# Altium footprint library texas.PCBLIB: 168 footprints (part 7 of 14)
Each footprint in its own frame and in the unit in brackets; x right, y up, seen from the top. Pads: shape width x height; smd on the part's side, far side on the other; paste and mask are expansions set on the pad; w line width, h text height; cw(c..) or ccw(c..) is an arc to the next point about the centre after c.
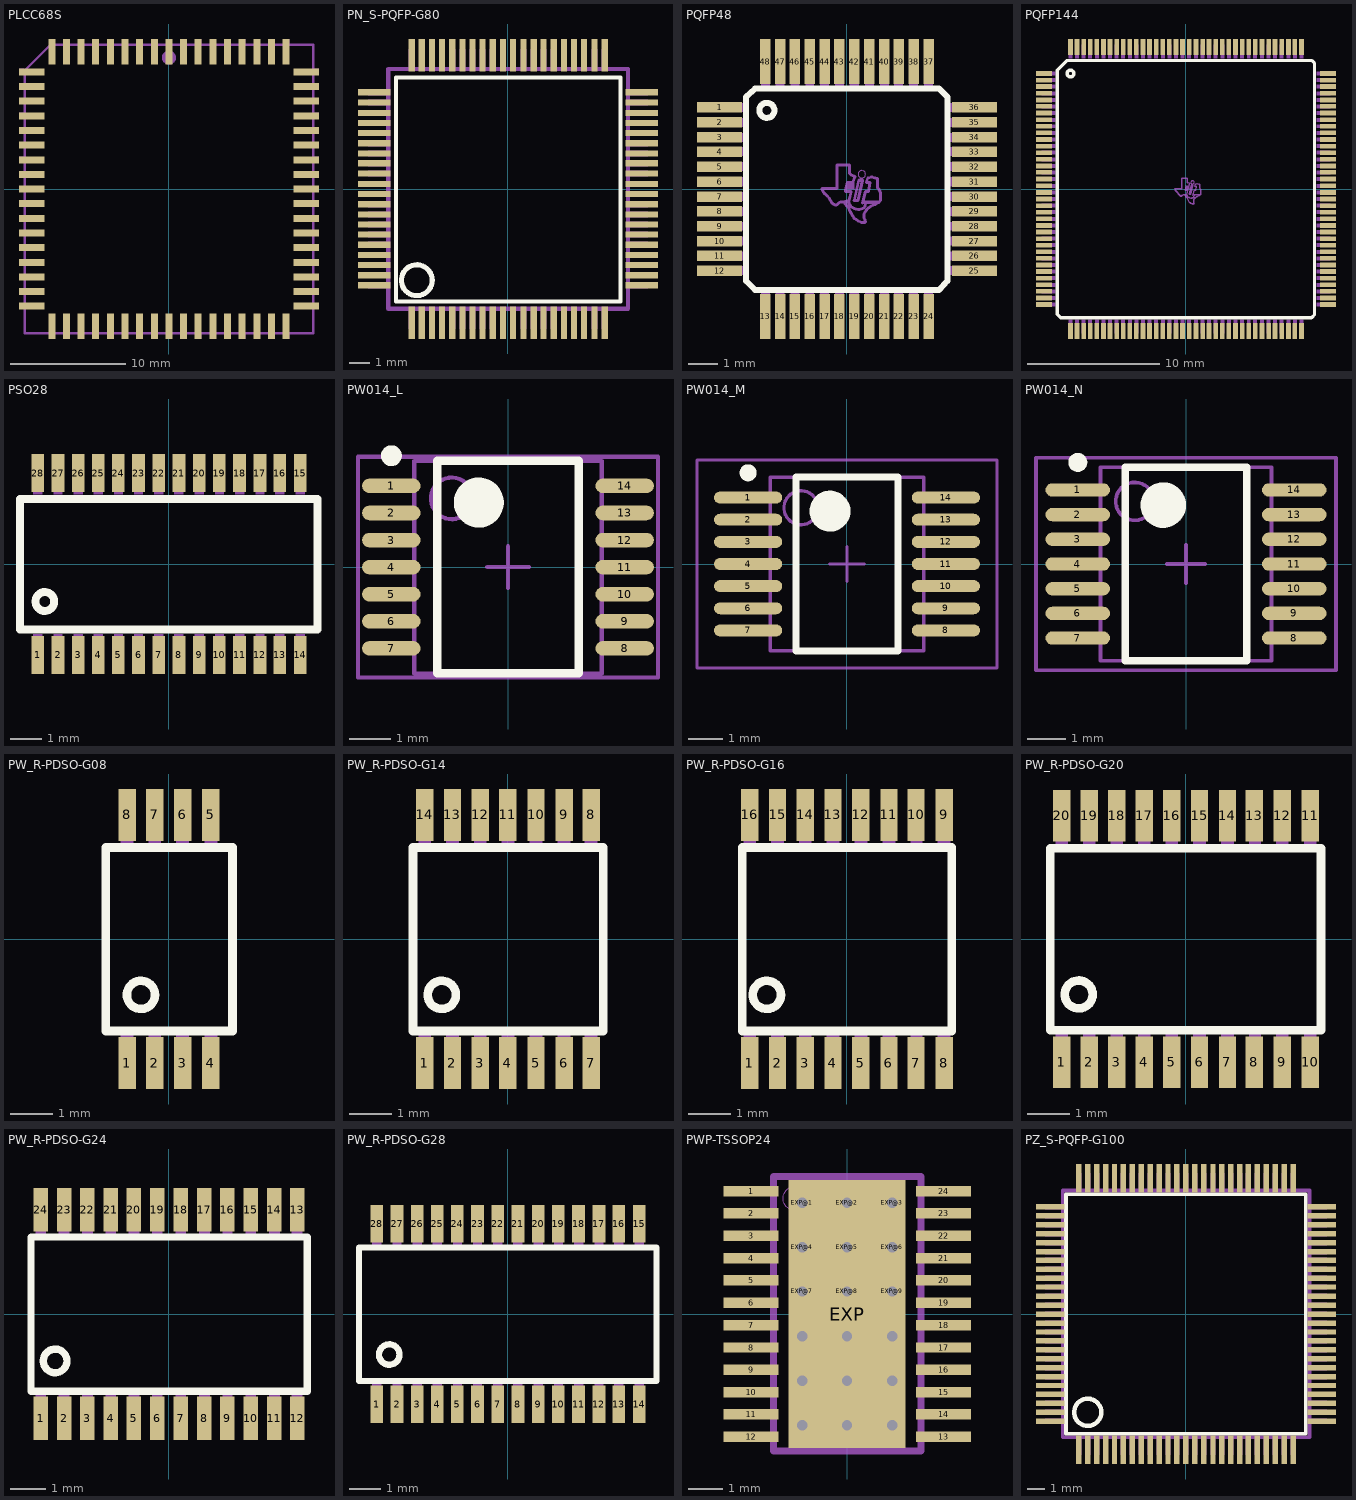
[diagram p6: the footprints below, top view; thin cyan lines are the x and y axes]

## PLCC68S [mil]
pads (68):
  rect 24x87 smd: 1(0,469) 2(-50,469) 3(-100,469) 4(-150,469) 5(-200,469) 6(-250,469) 7(-300,469) 8(-350,469) 9(-400,469) 27(-400,-468.5) 28(-350,-468.5) 29(-300,-468.5) 30(-250,-468.5) 31(-200,-468.5) 32(-150,-468.5) 33(-100,-468.5) 34(-50,-468.5) 35(0,-468.5) 36(50,-468.5) 37(100,-468.5) 38(150,-468.5) 39(200,-468.5) 40(250,-468.5) 41(300,-468.5) 42(350,-468.5) 43(400,-468.5) 61(400,469) 62(350,469) 63(300,469) 64(250,469) 65(200,469) 66(150,469) 67(100,469) 68(50,469)
  rect 87x24 smd: 10(-468.5,400) 11(-468.5,350) 12(-468.5,300) 13(-468.5,250) 14(-468.5,200) 15(-468.5,150) 16(-468.5,100) 17(-468.5,50) 18(-468.5,0) 19(-468.5,-50) 20(-468.5,-100) 21(-468.5,-150) 22(-468.5,-200) 23(-468.5,-250) 24(-468.5,-300) 25(-468.5,-350) 26(-468.5,-400) 44(469,-400) 45(469,-350) 46(469,-300) 47(469,-250) 48(469,-200) 49(469,-150) 50(469,-100) 51(469,-50) 52(469,0) 53(469,50) 54(469,100) 55(469,150) 56(469,200) 57(469,250) 58(469,300) 59(469,350) 60(469,400)
Mechanical 4:
  circle w24: c0,449 r12
  rectangle: -10.24,495 11,512
  rectangle: -60.24,495 -39.76,512
  rectangle: -110.24,495 -89.76,512
  rectangle: -160.24,495 -139.76,512
  rectangle: -210.24,495 -189.76,512
  rectangle: -260.24,495 -239.76,512
  rectangle: -310.24,495 -289.76,512
  rectangle: -360.24,495 -339.76,512
  rectangle: -410.24,495 -389.76,512
  rectangle: -511.81,390 -494.09,411
  rectangle: -511.81,340 -494.09,361
  rectangle: -511.81,290 -494.09,311
  rectangle: -511.81,240 -494.09,261
  rectangle: -511.81,190 -494.09,211
  rectangle: -511.81,140 -494.09,161
  rectangle: -511.81,90 -494.09,111
  rectangle: -511.81,40 -494.09,61
  rectangle: -511.81,-10.24 -494.09,11
  rectangle: -511.81,-60.24 -494.09,-39.76
  rectangle: -511.81,-110.24 -494.09,-89.76
  rectangle: -511.81,-160.24 -494.09,-139.76
  rectangle: -511.81,-210.24 -494.09,-189.76
  rectangle: -511.81,-260.24 -494.09,-239.76
  rectangle: -511.81,-310.24 -494.09,-289.76
  rectangle: -511.81,-360.24 -494.09,-339.76
  rectangle: -511.81,-410.24 -494.09,-389.76
  rectangle: -410.24,-511.81 -389.76,-494.09
  rectangle: -360.24,-511.81 -339.76,-494.09
  rectangle: -310.24,-511.81 -289.76,-494.09
  rectangle: -260.24,-511.81 -239.76,-494.09
  rectangle: -210.24,-511.81 -189.76,-494.09
  rectangle: -160.24,-511.81 -139.76,-494.09
  rectangle: -110.24,-511.81 -89.76,-494.09
  rectangle: -60.24,-511.81 -39.76,-494.09
  rectangle: -10.24,-511.81 11,-494.09
  rectangle: 40,-511.81 61,-494.09
  rectangle: 90,-511.81 111,-494.09
  rectangle: 140,-511.81 161,-494.09
  rectangle: 190,-511.81 211,-494.09
  rectangle: 240,-511.81 261,-494.09
  rectangle: 290,-511.81 311,-494.09
  rectangle: 340,-511.81 361,-494.09
  rectangle: 390,-511.81 411,-494.09
  rectangle: 495,-410.24 512,-389.76
  rectangle: 495,-360.24 512,-339.76
  rectangle: 495,-310.24 512,-289.76
  rectangle: 495,-260.24 512,-239.76
  rectangle: 495,-210.24 512,-189.76
  rectangle: 495,-160.24 512,-139.76
  rectangle: 495,-110.24 512,-89.76
  rectangle: 495,-60.24 512,-39.76
  rectangle: 495,-10.24 512,11
  rectangle: 495,40 512,61
  rectangle: 495,90 512,111
  rectangle: 495,140 512,161
  rectangle: 495,190 512,211
  rectangle: 495,240 512,261
  rectangle: 495,290 512,311
  rectangle: 495,340 512,361
  rectangle: 495,390 512,411
  rectangle: 390,495 411,512
  rectangle: 340,495 361,512
  rectangle: 290,495 311,512
  rectangle: 240,495 261,512
  rectangle: 190,495 211,512
  rectangle: 140,495 161,512
  rectangle: 90,495 111,512
  rectangle: 40,495 61,512
  lines w8: -492.13,-492.13 -492.13,405 -404.13,493 493,493 493,-492.13 -492.13,-492.13

## PN_S-PQFP-G80 [mil]
pads (80):
  rect 12x63 smd: 1(-187.01,-259.84) 2(-167.32,-259.84) 3(-147.64,-259.84) 4(-127.95,-259.84) 5(-108.27,-259.84) 6(-88.58,-259.84) 7(-68.9,-259.84) 8(-49.21,-259.84) 9(-29.53,-259.84) 10(-9.84,-259.84) 11(10,-259.84) 12(30,-259.84) 13(50,-259.84) 14(69,-259.84) 15(89,-259.84) 16(109,-259.84) 17(128,-259.84) 18(148,-259.84) 19(168,-259.84) 20(188,-259.84) 41(188,260) 42(168,260) 43(148,260) 44(128,260) 45(109,260) 46(89,260) 47(69,260) 48(50,260) 49(30,260) 50(10,260) 51(-9.84,260) 52(-29.53,260) 53(-49.21,260) 54(-68.9,260) 55(-88.58,260) 56(-108.27,260) 57(-127.95,260) 58(-147.64,260) 59(-167.32,260) 60(-187.01,260)
  rect 63x12 smd: 21(260,-187.01) 22(260,-167.32) 23(260,-147.64) 24(260,-127.95) 25(260,-108.27) 26(260,-88.58) 27(260,-68.9) 28(260,-49.21) 29(260,-29.53) 30(260,-9.84) 31(260,10) 32(260,30) 33(260,50) 34(260,69) 35(260,89) 36(260,109) 37(260,128) 38(260,148) 39(260,168) 40(260,188) 61(-259.84,188) 62(-259.84,168) 63(-259.84,148) 64(-259.84,128) 65(-259.84,109) 66(-259.84,89) 67(-259.84,69) 68(-259.84,50) 69(-259.84,30) 70(-259.84,10) 71(-259.84,-9.84) 72(-259.84,-29.53) 73(-259.84,-49.21) 74(-259.84,-68.9) 75(-259.84,-88.58) 76(-259.84,-108.27) 77(-259.84,-127.95) 78(-259.84,-147.64) 79(-259.84,-167.32) 80(-259.84,-187.01)
Top Overlay:
  circle w10: c-177.17,-177.17 r30
  lines w8: -217.32,-218.5 218.5,-218.5 218.5,216.54 -217.32,216.54 -217.32,-218.5
Mechanical 4:
  rectangle: -271.65,-192.91 -234.25,-181.1
  rectangle: -271.65,-173.23 -234.25,-161.42
  rectangle: -271.65,-153.54 -234.25,-141.73
  rectangle: -271.65,-133.86 -234.25,-122.05
  rectangle: -271.65,-114.17 -234.25,-102.36
  rectangle: -271.65,-94.49 -234.25,-82.68
  rectangle: -271.65,-74.8 -234.25,-62.99
  rectangle: -271.65,-55.12 -234.25,-43.31
  rectangle: -271.65,-35.43 -234.25,-23.62
  rectangle: -271.65,-15.75 -234.25,-3.94
  rectangle: -271.65,4 -234.25,16
  rectangle: -271.65,24 -234.25,36
  rectangle: -271.65,44 -234.25,56
  rectangle: -271.65,63 -234.25,75
  rectangle: -271.65,83 -234.25,95
  rectangle: -271.65,103 -234.25,115
  rectangle: -271.65,123 -234.25,134
  rectangle: -271.65,142 -234.25,154
  rectangle: -271.65,162 -234.25,174
  rectangle: -271.65,182 -234.25,193
  rectangle: -192.91,235 -181.1,272
  rectangle: -173.23,235 -161.42,272
  rectangle: -153.54,235 -141.73,272
  rectangle: -133.86,235 -122.05,272
  rectangle: -114.17,235 -102.36,272
  rectangle: -94.49,235 -82.68,272
  rectangle: -74.8,235 -62.99,272
  rectangle: -55.12,235 -43.31,272
  rectangle: -35.43,235 -23.62,272
  rectangle: -15.75,235 -3.94,272
  rectangle: 4,235 16,272
  rectangle: 24,235 36,272
  rectangle: 44,235 56,272
  rectangle: 63,235 75,272
  rectangle: 83,235 95,272
  rectangle: 103,235 115,272
  rectangle: 123,235 134,272
  rectangle: 142,235 154,272
  rectangle: 162,235 174,272
  rectangle: 182,235 193,272
  rectangle: 235,182 272,193
  rectangle: 235,162 272,174
  rectangle: 235,142 272,154
  rectangle: 235,123 272,134
  rectangle: 235,103 272,115
  rectangle: 235,83 272,95
  rectangle: 235,63 272,75
  rectangle: 235,44 272,56
  rectangle: 235,24 272,36
  rectangle: 235,4 272,16
  rectangle: 235,-15.75 272,-3.94
  rectangle: 235,-35.43 272,-23.62
  rectangle: 235,-55.12 272,-43.31
  rectangle: 235,-74.8 272,-62.99
  rectangle: 235,-94.49 272,-82.68
  rectangle: 235,-114.17 272,-102.36
  rectangle: 235,-133.86 272,-122.05
  rectangle: 235,-153.54 272,-141.73
  rectangle: 235,-173.23 272,-161.42
  rectangle: 235,-192.91 272,-181.1
  rectangle: 182,-271.65 193,-234.25
  rectangle: 162,-271.65 174,-234.25
  rectangle: 142,-271.65 154,-234.25
  rectangle: 123,-271.65 134,-234.25
  rectangle: 103,-271.65 115,-234.25
  rectangle: 83,-271.65 95,-234.25
  rectangle: 63,-271.65 75,-234.25
  rectangle: 44,-271.65 56,-234.25
  rectangle: 24,-271.65 36,-234.25
  rectangle: 4,-271.65 16,-234.25
  rectangle: -15.75,-271.65 -3.94,-234.25
  rectangle: -35.43,-271.65 -23.62,-234.25
  rectangle: -55.12,-271.65 -43.31,-234.25
  rectangle: -74.8,-271.65 -62.99,-234.25
  rectangle: -94.49,-271.65 -82.68,-234.25
  rectangle: -114.17,-271.65 -102.36,-234.25
  rectangle: -133.86,-271.65 -122.05,-234.25
  rectangle: -153.54,-271.65 -141.73,-234.25
  rectangle: -173.23,-271.65 -161.42,-234.25
  rectangle: -192.91,-271.65 -181.1,-234.25
  lines w8: -232.68,-232.68 -232.68,233 233,233 233,-232.68 -232.68,-232.68
3D body "PN0080A.stp": height 61.4, standoff -0.02, extent -275.39,-275.59 275.79,275.59

## PQFP48 [mil]
pads (48):
  rect 60x14 smd: 1(-169.29,109) 2(-169.29,89) 3(-169.29,69) 4(-169.29,50) 5(-169.29,30) 6(-169.29,10) 7(-169.29,-9.84) 8(-169.29,-29.53) 9(-169.29,-49.21) 10(-169.29,-68.9) 11(-169.29,-88.58) 12(-169.29,-108.27) 25(170,-108.27) 26(170,-88.58) 27(170,-68.9) 28(170,-49.21) 29(170,-29.53) 30(170,-9.84) 31(170,10) 32(170,30) 33(170,50) 34(170,69) 35(170,89) 36(170,109)
  rect 14x60 smd: 13(-108.27,-169.29) 14(-88.58,-169.29) 15(-68.9,-169.29) 16(-49.21,-169.29) 17(-29.53,-169.29) 18(-9.84,-169.29) 19(10,-169.29) 20(30,-169.29) 21(50,-169.29) 22(69,-169.29) 23(89,-169.29) 24(109,-169.29) 37(109,170) 38(89,170) 39(69,170) 40(50,170) 41(30,170) 42(10,170) 43(-9.84,170) 44(-29.53,170) 45(-49.21,170) 46(-68.9,170) 47(-88.58,170) 48(-108.27,170)
Top Overlay:
  circle w8: c-106.3,105 r10
  lines w8: -133.86,-122.05 -133.86,123 -122.05,134 123,134 134,123 134,-122.05 123,-133.86 -122.05,-133.86 -133.86,-122.05
Mechanical 4:
  drawing of 146 lines, arcs and shapes, not listed

## PQFP144 [mil]
pads (144):
  rect 48x14 smd: 1(-423.23,345) 2(-423.23,325) 3(-423.23,306) 4(-423.23,286) 5(-423.23,266) 6(-423.23,247) 7(-423.23,227) 8(-423.23,207) 9(-423.23,188) 10(-423.23,168) 11(-423.23,148) 12(-423.23,128) 13(-423.23,109) 14(-423.23,89) 15(-423.23,69) 16(-423.23,50) 17(-423.23,30) 18(-423.23,10) 19(-423.23,-9.84) 20(-423.23,-29.53) 21(-423.23,-49.21) 22(-423.23,-68.9) 23(-423.23,-88.58) 24(-423.23,-108.27) 25(-423.23,-127.95) 26(-423.23,-147.64) 27(-423.23,-167.32) 28(-423.23,-187.01) 29(-423.23,-206.69) 30(-423.23,-226.38) 31(-423.23,-246.06) 32(-423.23,-265.75) 33(-423.23,-285.43) 34(-423.23,-305.12) 35(-423.23,-324.8) 36(-423.23,-344.49) 73(424,-344.49) 74(424,-324.8) 75(424,-305.12) 76(424,-285.43) 77(424,-265.75) 78(424,-246.06) 79(424,-226.38) 80(424,-206.69) 81(424,-187.01) 82(424,-167.32) 83(424,-147.64) 84(424,-127.95) 85(424,-108.27) 86(424,-88.58) 87(424,-68.9) 88(424,-49.21) 89(424,-29.53) 90(424,-9.84) 91(424,10) 92(424,30) 93(424,50) 94(424,69) 95(424,89) 96(424,109) 97(424,128) 98(424,148) 99(424,168) 100(424,188) 101(424,207) 102(424,227) 103(424,247) 104(424,266) 105(424,286) 106(424,306) 107(424,325) 108(424,345)
  rect 14x48 smd: 37(-344.49,-423.23) 38(-324.8,-423.23) 39(-305.12,-423.23) 40(-285.43,-423.23) 41(-265.75,-423.23) 42(-246.06,-423.23) 43(-226.38,-423.23) 44(-206.69,-423.23) 45(-187.01,-423.23) 46(-167.32,-423.23) 47(-147.64,-423.23) 48(-127.95,-423.23) 49(-108.27,-423.23) 50(-88.58,-423.23) 51(-68.9,-423.23) 52(-49.21,-423.23) 53(-29.53,-423.23) 54(-9.84,-423.23) 55(10,-423.23) 56(30,-423.23) 57(50,-423.23) 58(69,-423.23) 59(89,-423.23) 60(109,-423.23) 61(128,-423.23) 62(148,-423.23) 63(168,-423.23) 64(188,-423.23) 65(207,-423.23) 66(227,-423.23) 67(247,-423.23) 68(266,-423.23) 69(286,-423.23) 70(306,-423.23) 71(325,-423.23) 72(345,-423.23) 109(345,424) 110(325,424) 111(306,424) 112(286,424) 113(266,424) 114(247,424) 115(227,424) 116(207,424) 117(188,424) 118(168,424) 119(148,424) 120(128,424) 121(109,424) 122(89,424) 123(69,424) 124(50,424) 125(30,424) 126(10,424) 127(-9.84,424) 128(-29.53,424) 129(-49.21,424) 130(-68.9,424) 131(-88.58,424) 132(-108.27,424) 133(-127.95,424) 134(-147.64,424) 135(-167.32,424) 136(-187.01,424) 137(-206.69,424) 138(-226.38,424) 139(-246.06,424) 140(-265.75,424) 141(-285.43,424) 142(-305.12,424) 143(-324.8,424) 144(-344.49,424)
Top Overlay:
  circle w10: c-344.49,345 r10
  lines w10: -383.86,-374.02 -383.86,355 -354.33,384 375,384 384,375 384,-374.02 375,-383.86 -374.02,-383.86 -383.86,-374.02
Mechanical 4:
  drawing of 242 lines, arcs and shapes, not listed
  text "PGE(S-PQFP-G144)" at -150,-324.02 h37.2

## PSO28 [mil]
pads (28):
  rect 16x48 smd: 1(-166.34,-115.16) 2(-140.75,-115.16) 3(-115.16,-115.16) 4(-89.57,-115.16) 5(-63.98,-115.16) 6(-38.39,-115.16) 7(-12.8,-115.16) 8(13,-115.16) 9(39,-115.16) 10(64,-115.16) 11(90,-115.16) 12(116,-115.16) 13(141,-115.16) 14(167,-115.16) 15(167,116) 16(141,116) 17(116,116) 18(90,116) 19(64,116) 20(39,116) 21(13,116) 22(-12.8,116) 23(-38.39,116) 24(-63.98,116) 25(-89.57,116) 26(-115.16,116) 27(-140.75,116) 28(-166.34,116)
Top Overlay:
  circle w10: c-157.48,-47.24 r12
  lines w10: -188.98,-82.68 189,-82.68 189,83 -188.98,83 -188.98,-82.68
Mechanical 4:
  rectangle: -172.24,-129.92 -160.43,-88.58
  rectangle: -146.65,-129.92 -134.84,-88.58
  rectangle: -121.06,-129.92 -109.25,-88.58
  rectangle: -95.47,-129.92 -83.66,-88.58
  rectangle: -69.88,-129.92 -58.07,-88.58
  rectangle: -44.29,-129.92 -32.48,-88.58
  rectangle: -18.7,-129.92 -6.89,-88.58
  rectangle: 7,-129.92 19,-88.58
  rectangle: 33,-129.92 45,-88.58
  rectangle: 59,-129.92 70,-88.58
  rectangle: 84,-129.92 96,-88.58
  rectangle: 110,-129.92 122,-88.58
  rectangle: 135,-129.92 147,-88.58
  rectangle: 161,-129.92 173,-88.58
  rectangle: 161,89 173,130
  rectangle: 135,89 147,130
  rectangle: 110,89 122,130
  rectangle: 84,89 96,130
  rectangle: 59,89 70,130
  rectangle: 33,89 45,130
  rectangle: 7,89 19,130
  rectangle: -18.7,89 -6.89,130
  rectangle: -44.29,89 -32.48,130
  rectangle: -69.88,89 -58.07,130
  rectangle: -95.47,89 -83.66,130
  rectangle: -121.06,89 -109.25,130
  rectangle: -146.65,89 -134.84,130
  rectangle: -172.24,89 -160.43,130

## PW014_L [mm] "TSOP, 14-Leads, Body 5x4.4mm, Pitch 0.65mm, IPC High Density"
height 1.2
pads (14):
  oval 1.4x0.35 smd: 1(-2.8,1.95) 2(-2.8,1.3) 3(-2.8,0.65) 4(-2.8,0) 5(-2.8,-0.65) 6(-2.8,-1.3) 7(-2.8,-1.95) 8(2.8,-1.95) 9(2.8,-1.3) 10(2.8,-0.65) 11(2.8,0) 12(2.8,0.65) 13(2.8,1.3) 14(2.8,1.95)
Top Overlay:
  circle w0.6: c-0.7,1.55 r0.3
  circle w0.25: c-2.8,2.675 r0.125
  lines w0.2: -1.7,-2.55 1.7,-2.55 1.7,2.55 -1.7,2.55 -1.7,-2.55
Mechanical 13:
  circle w0.1: c-1.35,1.65 r0.5
  lines w0.1: -2.25,-2.55 2.25,-2.55 2.25,2.55 -2.25,2.55 -2.25,-2.55
Mechanical 15:
  lines w0.1: -0.5,0 0.5,0 ; 0,-0.5 0,0.5 ; -3.6,-2.65 3.6,-2.65 3.6,2.65 -3.6,2.65 -3.6,-2.65
3D body: height 1.2, standoff 0, extent -2.25,-2.55 2.25,2.55

## PW014_M [mm] "TSOP, 14-Leads, Body 5x4.4mm, Pitch 0.65mm, IPC Low Density"
height 1.2
pads (14):
  oval 2x0.35 smd: 1(-2.9,1.95) 2(-2.9,1.3) 3(-2.9,0.65) 4(-2.9,0) 5(-2.9,-0.65) 6(-2.9,-1.3) 7(-2.9,-1.95) 8(2.9,-1.95) 9(2.9,-1.3) 10(2.9,-0.65) 11(2.9,0) 12(2.9,0.65) 13(2.9,1.3) 14(2.9,1.95)
Top Overlay:
  circle w0.25: c-2.9,2.675 r0.125
  circle w0.6: c-0.5,1.55 r0.3
  lines w0.2: -1.5,-2.55 -1.5,2.55 1.5,2.55 1.5,-2.55 -1.5,-2.55
Mechanical 13:
  circle w0.1: c-1.35,1.65 r0.5
  lines w0.1: -2.25,-2.55 -2.25,2.55 2.25,2.55 2.25,-2.55 -2.25,-2.55
Mechanical 15:
  lines w0.1: -0.5,0 0.5,0 ; 0,-0.5 0,0.5 ; -4.4,-3.05 -4.4,3.05 4.4,3.05 4.4,-3.05 -4.4,-3.05
3D body: height 1.2, standoff 0, extent -2.25,-2.55 2.25,2.55

## PW014_N [mm] "TSOP, 14-Leads, Body 5x4.4mm, Pitch 0.65mm, IPC Medium Density"
height 1.2
pads (14):
  oval 1.7x0.35 smd: 1(-2.85,1.95) 2(-2.85,1.3) 3(-2.85,0.65) 4(-2.85,0) 5(-2.85,-0.65) 6(-2.85,-1.3) 7(-2.85,-1.95) 8(2.85,-1.95) 9(2.85,-1.3) 10(2.85,-0.65) 11(2.85,0) 12(2.85,0.65) 13(2.85,1.3) 14(2.85,1.95)
Top Overlay:
  circle w0.6: c-0.6,1.55 r0.3
  circle w0.25: c-2.85,2.675 r0.125
  lines w0.2: -1.6,-2.55 1.6,-2.55 1.6,2.55 -1.6,2.55 -1.6,-2.55
Mechanical 13:
  circle w0.1: c-1.35,1.65 r0.5
  lines w0.1: -2.25,-2.55 2.25,-2.55 2.25,2.55 -2.25,2.55 -2.25,-2.55
Mechanical 15:
  lines w0.1: -0.5,0 0.5,0 ; 0,-0.5 0,0.5 ; -3.95,-2.8 3.95,-2.8 3.95,2.8 -3.95,2.8 -3.95,-2.8
3D body: height 1.2, standoff 0, extent -2.25,-2.55 2.25,2.55

## PW_R-PDSO-G08 [mil]
pads (8):
  rect 16x48 smd: 1(-38.39,-114.17) 2(-12.8,-114.17) 3(13,-114.17) 4(39,-114.17) 5(39,115) 6(13,115) 7(-12.8,115) 8(-38.39,115)
Top Overlay:
  circle w8: c-25.59,-51.18 r13
  lines w8: -58.07,-84.65 59,-84.65 59,85 -58.07,85 -58.07,-84.65
Mechanical 4:
  rectangle: -44.29,-129.92 -32.48,-87.8
  rectangle: -18.7,-129.92 -6.89,-87.8
  rectangle: 7,-129.92 19,-87.8
  rectangle: 33,-129.92 45,-87.8
  region: 45,130 33,130 33,88 45,88
  region: 19,130 7,130 7,88 19,88
  region: -6.89,130 -18.7,130 -18.7,88 -6.89,88
  region: -32.48,130 -44.29,130 -44.29,88 -32.48,88

## PW_R-PDSO-G14 [mil]
pads (14):
  rect 16x48 smd: 1(-76.77,-114.17) 2(-51.18,-114.17) 3(-25.59,-114.17) 4(0,-114.17) 5(26,-114.17) 6(52,-114.17) 7(77,-114.17) 8(77,115) 9(52,115) 10(26,115) 11(0,115) 12(-25.59,115) 13(-51.18,115) 14(-76.77,115)
Top Overlay:
  circle w8: c-61.02,-51.18 r13
  lines w8: -87.6,-84.65 -87.6,85 88,85 88,-84.65 -87.6,-84.65
Mechanical 4:
  region: -70.87,130 -82.68,130 -82.68,88 -70.87,88
  region: -45.28,130 -57.09,130 -57.09,88 -45.28,88
  region: -19.68,130 -31.5,130 -31.5,88 -19.69,88
  region: 6,130 -5.91,130 -5.91,88 6,88
  region: 32,130 20,130 20,88 32,88
  region: 58,130 46,130 46,88 58,88
  region: 83,130 71,130 71,88 83,88
  rectangle: 71,-129.92 83,-87.8
  rectangle: 46,-129.92 58,-87.8
  rectangle: 20,-129.92 32,-87.8
  rectangle: -5.91,-129.92 6,-87.8
  rectangle: -31.5,-129.92 -19.68,-87.8
  rectangle: -57.09,-129.92 -45.28,-87.8
  rectangle: -82.68,-129.92 -70.87,-87.8

## PW_R-PDSO-G16 [mil]
pads (16):
  rect 16x48 smd: 1(-89.57,-114.17) 2(-63.98,-114.17) 3(-38.39,-114.17) 4(-12.8,-114.17) 5(13,-114.17) 6(39,-114.17) 7(64,-114.17) 8(90,-114.17) 9(90,115) 10(64,115) 11(39,115) 12(13,115) 13(-12.8,115) 14(-38.39,115) 15(-63.98,115) 16(-89.57,115)
Top Overlay:
  circle w8: c-73.82,-51.18 r13
  lines w8: -96.46,-84.65 -96.46,85 97,85 97,-84.65 -96.46,-84.65
Mechanical 4:
  region: -83.66,130 -95.47,130 -95.47,88 -83.66,88
  region: -58.07,130 -69.88,130 -69.88,88 -58.07,88
  region: -32.48,130 -44.29,130 -44.29,88 -32.48,88
  region: -6.89,130 -18.7,130 -18.7,88 -6.89,88
  region: 19,130 7,130 7,88 19,88
  region: 45,130 33,130 33,88 45,88
  region: 70,130 59,130 59,88 70,88
  region: 96,130 84,130 84,88 96,88
  rectangle: 84,-129.92 96,-87.8
  rectangle: 59,-129.92 70,-87.8
  rectangle: 33,-129.92 45,-87.8
  rectangle: 7,-129.92 19,-87.8
  rectangle: -18.7,-129.92 -6.89,-87.8
  rectangle: -44.29,-129.92 -32.48,-87.8
  rectangle: -69.88,-129.92 -58.07,-87.8
  rectangle: -95.47,-129.92 -83.66,-87.8

## PW_R-PDSO-G20 [mil]
pads (20):
  rect 16x48 smd: 1(-115.16,-114.17) 2(-89.57,-114.17) 3(-63.98,-114.17) 4(-38.39,-114.17) 5(-12.8,-114.17) 6(13,-114.17) 7(39,-114.17) 8(64,-114.17) 9(90,-114.17) 10(116,-114.17) 11(116,115) 12(90,115) 13(64,115) 14(39,115) 15(13,115) 16(-12.8,115) 17(-38.39,115) 18(-63.98,115) 19(-89.57,115) 20(-115.16,115)
Top Overlay:
  circle w8: c-99.41,-51.18 r13
  lines w8: -125.98,-84.65 -125.98,85 126,85 126,-84.65 -125.98,-84.65
Mechanical 4:
  region: -109.25,130 -121.06,130 -121.06,88 -109.25,88
  region: -83.66,130 -95.47,130 -95.47,88 -83.66,88
  region: -58.07,130 -69.88,130 -69.88,88 -58.07,88
  region: -32.48,130 -44.29,130 -44.29,88 -32.48,88
  region: -6.89,130 -18.7,130 -18.7,88 -6.89,88
  region: 19,130 7,130 7,88 19,88
  region: 45,130 33,130 33,88 45,88
  region: 70,130 59,130 59,88 70,88
  region: 96,130 84,130 84,88 96,88
  region: 122,130 110,130 110,88 122,88
  rectangle: 110,-129.92 122,-87.8
  rectangle: 84,-129.92 96,-87.8
  rectangle: 59,-129.92 70,-87.8
  rectangle: 33,-129.92 45,-87.8
  rectangle: 7,-129.92 19,-87.8
  rectangle: -18.7,-129.92 -6.89,-87.8
  rectangle: -44.29,-129.92 -32.48,-87.8
  rectangle: -69.88,-129.92 -58.07,-87.8
  rectangle: -95.47,-129.92 -83.66,-87.8
  rectangle: -121.06,-129.92 -109.25,-87.8

## PW_R-PDSO-G24 [mil]
pads (24):
  rect 16x48 smd: 1(-140.75,-114.17) 2(-115.16,-114.17) 3(-89.57,-114.17) 4(-63.98,-114.17) 5(-38.39,-114.17) 6(-12.8,-114.17) 7(13,-114.17) 8(39,-114.17) 9(64,-114.17) 10(90,-114.17) 11(116,-114.17) 12(141,-114.17) 13(141,115) 14(116,115) 15(90,115) 16(64,115) 17(39,115) 18(13,115) 19(-12.8,115) 20(-38.39,115) 21(-63.98,115) 22(-89.57,115) 23(-115.16,115) 24(-140.75,115)
Top Overlay:
  circle w8: c-125,-51.18 r13
  lines w8: -151.57,-84.65 -151.57,85 152,85 152,-84.65 -151.57,-84.65
Mechanical 4:
  region: -134.84,130 -146.65,130 -146.65,88 -134.84,88
  region: -109.25,130 -121.06,130 -121.06,88 -109.25,88
  region: -83.66,130 -95.47,130 -95.47,88 -83.66,88
  region: -58.07,130 -69.88,130 -69.88,88 -58.07,88
  region: -32.48,130 -44.29,130 -44.29,88 -32.48,88
  region: -6.89,130 -18.7,130 -18.7,88 -6.89,88
  region: 19,130 7,130 7,88 19,88
  region: 45,130 33,130 33,88 45,88
  region: 70,130 59,130 59,88 70,88
  region: 96,130 84,130 84,88 96,88
  region: 122,130 110,130 110,88 122,88
  region: 147,130 135,130 135,88 147,88
  rectangle: 135,-129.92 147,-87.8
  rectangle: 110,-129.92 122,-87.8
  rectangle: 84,-129.92 96,-87.8
  rectangle: 59,-129.92 70,-87.8
  rectangle: 33,-129.92 45,-87.8
  rectangle: 7,-129.92 19,-87.8
  rectangle: -18.7,-129.92 -6.89,-87.8
  rectangle: -44.29,-129.92 -32.48,-87.8
  rectangle: -69.88,-129.92 -58.07,-87.8
  rectangle: -95.47,-129.92 -83.66,-87.8
  rectangle: -121.06,-129.92 -109.25,-87.8
  rectangle: -146.65,-129.92 -134.84,-87.8

## PW_R-PDSO-G28 [mil]
pads (28):
  rect 16x48 smd: 1(-166.34,-114.17) 2(-140.75,-114.17) 3(-115.16,-114.17) 4(-89.57,-114.17) 5(-63.98,-114.17) 6(-38.39,-114.17) 7(-12.8,-114.17) 8(13,-114.17) 9(39,-114.17) 10(64,-114.17) 11(90,-114.17) 12(116,-114.17) 13(141,-114.17) 14(167,-114.17) 15(167,115) 16(141,115) 17(116,115) 18(90,115) 19(64,115) 20(39,115) 21(13,115) 22(-12.8,115) 23(-38.39,115) 24(-63.98,115) 25(-89.57,115) 26(-115.16,115) 27(-140.75,115) 28(-166.34,115)
Top Overlay:
  circle w8: c-150.59,-51.18 r13
  lines w8: -188.98,-84.65 -188.98,85 189,85 189,-84.65 -188.98,-84.65
Mechanical 4:
  region: -160.43,130 -172.24,130 -172.24,88 -160.43,88
  region: -134.84,130 -146.65,130 -146.65,88 -134.84,88
  region: -109.25,130 -121.06,130 -121.06,88 -109.25,88
  region: -83.66,130 -95.47,130 -95.47,88 -83.66,88
  region: -58.07,130 -69.88,130 -69.88,88 -58.07,88
  region: -32.48,130 -44.29,130 -44.29,88 -32.48,88
  region: -6.89,130 -18.7,130 -18.7,88 -6.89,88
  region: 19,130 7,130 7,88 19,88
  region: 45,130 33,130 33,88 45,88
  region: 70,130 59,130 59,88 70,88
  region: 96,130 84,130 84,88 96,88
  region: 122,130 110,130 110,88 122,88
  region: 147,130 135,130 135,88 147,88
  region: 173,130 161,130 161,88 173,88
  rectangle: 161,-129.92 173,-87.8
  rectangle: 135,-129.92 147,-87.8
  rectangle: 110,-129.92 122,-87.8
  rectangle: 84,-129.92 96,-87.8
  rectangle: 59,-129.92 70,-87.8
  rectangle: 33,-129.92 45,-87.8
  rectangle: 7,-129.92 19,-87.8
  rectangle: -18.7,-129.92 -6.89,-87.8
  rectangle: -44.29,-129.92 -32.48,-87.8
  rectangle: -69.88,-129.92 -58.07,-87.8
  rectangle: -95.47,-129.92 -83.66,-87.8
  rectangle: -121.06,-129.92 -109.25,-87.8
  rectangle: -146.65,-129.92 -134.84,-87.8
  rectangle: -172.24,-129.92 -160.43,-87.8

## PWP-TSSOP24 [mil]
pads (43):
  rect 63x12 smd: 1(-110.24,141) 2(-110.24,116) 3(-110.24,90) 4(-110.24,64) 5(-110.24,39) 6(-110.24,13) 7(-110.24,-12.8) 8(-110.24,-38.39) 9(-110.24,-63.98) 10(-110.24,-89.57) 11(-110.24,-115.16) 12(-110.24,-140.75) 13(111,-140.75) 14(111,-115.16) 15(111,-89.57) 16(111,-63.98) 17(111,-38.39) 18(111,-12.8) 19(111,13) 20(111,39) 21(111,64) 22(111,90) 23(111,116) 24(111,141)
  rect 134x308 smd: EXP(0,0)
  round 28 hole 12: EXP@1(-51.18,128) EXP@2(0,128) EXP@3(52,128) EXP@4(-51.18,77) EXP@5(0,77) EXP@6(52,77) EXP@7(-51.18,26) EXP@8(0,26) EXP@9(52,26) EXP@10(-51.18,-25.59) EXP@11(0,-25.59) EXP@12(52,-25.59) EXP@13(-51.18,-76.77) EXP@14(0,-76.77) EXP@15(52,-76.77) EXP@16(-51.18,-127.95) EXP@17(0,-127.95) EXP@18(52,-127.95)
Top Paste:
  rectangle: -140.75,136 -79.72,146
  rectangle: -140.75,111 -79.72,121
  rectangle: -140.75,85 -79.72,95
  rectangle: -140.75,60 -79.72,69
  rectangle: -140.75,34 -79.72,44
  rectangle: -140.75,8 -79.72,18
  rectangle: -140.75,-17.72 -79.72,-7.87
  rectangle: -140.75,-43.31 -79.72,-33.46
  rectangle: -140.75,-68.9 -79.72,-59.06
  rectangle: -140.75,-94.49 -79.72,-84.65
  rectangle: -140.75,-120.08 -79.72,-110.24
  rectangle: -140.75,-145.67 -79.72,-135.83
  region: 141,-135.83 80,-135.83 80,-145.67 141,-145.67
  region: 141,-110.24 80,-110.24 80,-120.08 141,-120.08
  region: 141,-84.65 80,-84.65 80,-94.49 141,-94.49
  region: 141,-59.06 80,-59.06 80,-68.9 141,-68.9
  region: 141,-33.46 80,-33.46 80,-43.31 141,-43.31
  region: 141,-7.87 80,-7.87 80,-17.72 141,-17.72
  region: 141,18 80,18 80,8 141,8
  region: 141,44 80,44 80,34 141,34
  region: 141,69 80,69 80,60 141,60
  region: 141,95 80,95 80,85 141,85
  region: 141,121 80,121 80,111 141,111
  region: 141,146 80,146 80,136 141,136
  rectangle: -47.24,-101.38 48,102
Top Solder:
  rectangle: -143.7,133 -76.77,149
  rectangle: -143.7,108 -76.77,124
  rectangle: -143.7,82 -76.77,98
  rectangle: -143.7,57 -76.77,72
  rectangle: -143.7,31 -76.77,47
  rectangle: -143.7,5 -76.77,21
  rectangle: -143.7,-20.67 -76.77,-4.92
  rectangle: -143.7,-46.26 -76.77,-30.51
  rectangle: -143.7,-71.85 -76.77,-56.1
  rectangle: -143.7,-97.44 -76.77,-81.69
  rectangle: -143.7,-123.03 -76.77,-107.28
  rectangle: -143.7,-148.62 -76.77,-132.87
  region: 144,-132.87 77,-132.87 77,-148.62 144,-148.62
  region: 144,-107.28 77,-107.28 77,-123.03 144,-123.03
  region: 144,-81.69 77,-81.69 77,-97.44 144,-97.44
  region: 144,-56.1 77,-56.1 77,-71.85 144,-71.85
  region: 144,-30.51 77,-30.51 77,-46.26 144,-46.26
  region: 144,-4.92 77,-4.92 77,-20.67 144,-20.67
  region: 144,21 77,21 77,5 144,5
  region: 144,47 77,47 77,31 144,31
  region: 144,72 77,72 77,57 144,57
  region: 144,98 77,98 77,82 144,82
  region: 144,124 77,124 77,108 144,108
  region: 144,149 77,149 77,133 144,133
  rectangle: -66.93,-153.54 67,154
Mechanical 4:
  circle w0: c-61.02,133 r13
  rectangle: -125.98,136 -86.61,146
  rectangle: -125.98,111 -86.61,121
  rectangle: -125.98,85 -86.61,95
  rectangle: -125.98,60 -86.61,69
  rectangle: -125.98,34 -86.61,44
  rectangle: -125.98,8 -86.61,18
  rectangle: -125.98,-17.72 -86.61,-7.87
  rectangle: -125.98,-43.31 -86.61,-33.46
  rectangle: -125.98,-68.9 -86.61,-59.06
  rectangle: -125.98,-94.49 -86.61,-84.65
  rectangle: -125.98,-120.08 -86.61,-110.24
  rectangle: -125.98,-145.67 -86.61,-135.83
  region: 126,-135.83 87,-135.83 87,-145.67 126,-145.67
  region: 126,-110.24 87,-110.24 87,-120.08 126,-120.08
  region: 126,-84.65 87,-84.65 87,-94.49 126,-94.49
  region: 126,-59.06 87,-59.06 87,-68.9 126,-68.9
  region: 126,-33.46 87,-33.46 87,-43.31 126,-43.31
  region: 126,-7.87 87,-7.87 87,-17.72 126,-17.72
  region: 126,18 87,18 87,8 126,8
  region: 126,44 87,44 87,34 126,34
  region: 126,69 87,69 87,60 126,60
  region: 126,95 87,95 87,85 126,85
  region: 126,121 87,121 87,111 126,111
  region: 126,146 87,146 87,136 126,136
  lines w8: -84.65,-157.48 85,-157.48 85,158 -84.65,158 -84.65,-157.48

## PZ_S-PQFP-G100 [mil]
pads (100):
  rect 12x63 smd: 1(-236.22,-299.21) 2(-216.54,-299.21) 3(-196.85,-299.21) 4(-177.17,-299.21) 5(-157.48,-299.21) 6(-137.8,-299.21) 7(-118.11,-299.21) 8(-98.43,-299.21) 9(-78.74,-299.21) 10(-59.06,-299.21) 11(-39.37,-299.21) 12(-19.68,-299.21) 13(0,-299.21) 14(20,-299.21) 15(40,-299.21) 16(60,-299.21) 17(79,-299.21) 18(99,-299.21) 19(119,-299.21) 20(138,-299.21) 21(158,-299.21) 22(178,-299.21) 23(197,-299.21) 24(217,-299.21) 25(237,-299.21) 51(237,300) 52(217,300) 53(197,300) 54(178,300) 55(158,300) 56(138,300) 57(119,300) 58(99,300) 59(79,300) 60(60,300) 61(40,300) 62(20,300) 63(0,300) 64(-19.68,300) 65(-39.37,300) 66(-59.06,300) 67(-78.74,300) 68(-98.43,300) 69(-118.11,300) 70(-137.8,300) 71(-157.48,300) 72(-177.17,300) 73(-196.85,300) 74(-216.54,300) 75(-236.22,300)
  rect 63x12 smd: 26(300,-236.22) 27(300,-216.54) 28(300,-196.85) 29(300,-177.17) 30(300,-157.48) 31(300,-137.8) 32(300,-118.11) 33(300,-98.43) 34(300,-78.74) 35(300,-59.06) 36(300,-39.37) 37(300,-19.68) 38(300,0) 39(300,20) 40(300,40) 41(300,60) 42(300,79) 43(300,99) 44(300,119) 45(300,138) 46(300,158) 47(300,178) 48(300,197) 49(300,217) 50(300,237) 76(-299.21,237) 77(-299.21,217) 78(-299.21,197) 79(-299.21,178) 80(-299.21,158) 81(-299.21,138) 82(-299.21,119) 83(-299.21,99) 84(-299.21,79) 85(-299.21,60) 86(-299.21,40) 87(-299.21,20) 88(-299.21,0) 89(-299.21,-19.68) 90(-299.21,-39.37) 91(-299.21,-59.06) 92(-299.21,-78.74) 93(-299.21,-98.43) 94(-299.21,-118.11) 95(-299.21,-137.8) 96(-299.21,-157.48) 97(-299.21,-177.17) 98(-299.21,-196.85) 99(-299.21,-216.54) 100(-299.21,-236.22)
Top Overlay:
  circle w10: c-216.54,-216.54 r30
  lines w8: -264.57,-264.17 265,-264.17 265,265 -264.57,265 -264.57,-264.17
Mechanical 4:
  rectangle: -242.13,-311.02 -230.31,-273.62
  rectangle: -222.44,-311.02 -210.63,-273.62
  rectangle: -202.76,-311.02 -190.94,-273.62
  rectangle: -183.07,-311.02 -171.26,-273.62
  rectangle: -163.39,-311.02 -151.57,-273.62
  rectangle: -143.7,-311.02 -131.89,-273.62
  rectangle: -124.02,-311.02 -112.2,-273.62
  rectangle: -104.33,-311.02 -92.52,-273.62
  rectangle: -84.65,-311.02 -72.83,-273.62
  rectangle: -64.96,-311.02 -53.15,-273.62
  rectangle: -45.28,-311.02 -33.46,-273.62
  rectangle: -25.59,-311.02 -13.78,-273.62
  rectangle: -5.91,-311.02 6,-273.62
  rectangle: 14,-311.02 26,-273.62
  rectangle: 34,-311.02 46,-273.62
  rectangle: 54,-311.02 65,-273.62
  rectangle: 73,-311.02 85,-273.62
  rectangle: 93,-311.02 105,-273.62
  rectangle: 113,-311.02 125,-273.62
  rectangle: 132,-311.02 144,-273.62
  rectangle: 152,-311.02 164,-273.62
  rectangle: 172,-311.02 184,-273.62
  rectangle: 191,-311.02 203,-273.62
  rectangle: 211,-311.02 223,-273.62
  rectangle: 231,-311.02 243,-273.62
  rectangle: 274,-242.13 312,-230.31
  rectangle: 274,-222.44 312,-210.63
  rectangle: 274,-202.76 312,-190.94
  rectangle: 274,-183.07 312,-171.26
  rectangle: 274,-163.39 312,-151.57
  rectangle: 274,-143.7 312,-131.89
  rectangle: 274,-124.02 312,-112.2
  rectangle: 274,-104.33 312,-92.52
  rectangle: 274,-84.65 312,-72.83
  rectangle: 274,-64.96 312,-53.15
  rectangle: 274,-45.28 312,-33.46
  rectangle: 274,-25.59 312,-13.78
  rectangle: 274,-5.91 312,6
  rectangle: 274,14 312,26
  rectangle: 274,34 312,46
  rectangle: 274,54 312,65
  rectangle: 274,73 312,85
  rectangle: 274,93 312,105
  rectangle: 274,113 312,125
  rectangle: 274,132 312,144
  rectangle: 274,152 312,164
  rectangle: 274,172 312,184
  rectangle: 274,191 312,203
  rectangle: 274,211 312,223
  rectangle: 274,231 312,243
  rectangle: 231,274 243,312
  rectangle: 211,274 223,312
  rectangle: 191,274 203,312
  rectangle: 172,274 184,312
  rectangle: 152,274 164,312
  rectangle: 132,274 144,312
  rectangle: 113,274 125,312
  rectangle: 93,274 105,312
  rectangle: 73,274 85,312
  rectangle: 54,274 65,312
  rectangle: 34,274 46,312
  rectangle: 14,274 26,312
  rectangle: -5.91,274 6,312
  rectangle: -25.59,274 -13.78,312
  rectangle: -45.28,274 -33.46,312
  rectangle: -64.96,274 -53.15,312
  rectangle: -84.65,274 -72.83,312
  rectangle: -104.33,274 -92.52,312
  rectangle: -124.02,274 -112.2,312
  rectangle: -143.7,274 -131.89,312
  rectangle: -163.39,274 -151.57,312
  rectangle: -183.07,274 -171.26,312
  rectangle: -202.76,274 -190.94,312
  rectangle: -222.44,274 -210.63,312
  rectangle: -242.13,274 -230.31,312
  rectangle: -311.02,231 -273.62,243
  rectangle: -311.02,211 -273.62,223
  rectangle: -311.02,191 -273.62,203
  rectangle: -311.02,172 -273.62,184
  rectangle: -311.02,152 -273.62,164
  rectangle: -311.02,132 -273.62,144
  rectangle: -311.02,113 -273.62,125
  rectangle: -311.02,93 -273.62,105
  rectangle: -311.02,73 -273.62,85
  rectangle: -311.02,54 -273.62,65
  rectangle: -311.02,34 -273.62,46
  rectangle: -311.02,14 -273.62,26
  rectangle: -311.02,-5.91 -273.62,6
  rectangle: -311.02,-25.59 -273.62,-13.78
  rectangle: -311.02,-45.28 -273.62,-33.46
  rectangle: -311.02,-64.96 -273.62,-53.15
  rectangle: -311.02,-84.65 -273.62,-72.83
  rectangle: -311.02,-104.33 -273.62,-92.52
  rectangle: -311.02,-124.02 -273.62,-112.2
  rectangle: -311.02,-143.7 -273.62,-131.89
  rectangle: -311.02,-163.39 -273.62,-151.57
  rectangle: -311.02,-183.07 -273.62,-171.26
  rectangle: -311.02,-202.76 -273.62,-190.94
  rectangle: -311.02,-222.44 -273.62,-210.63
  rectangle: -311.02,-242.13 -273.62,-230.31
  lines w8: -272.05,-272.05 273,-272.05 273,273 -272.05,273 -272.05,-272.05
3D body "PZ100-L.step": height 63.11, standoff 0, extent -319.02,-319.02 319.01,319.01